# Altium schematic symbol library FPGA_Xilinx_Virtex7.SchLib: 34 symbols (part 34 of 34)
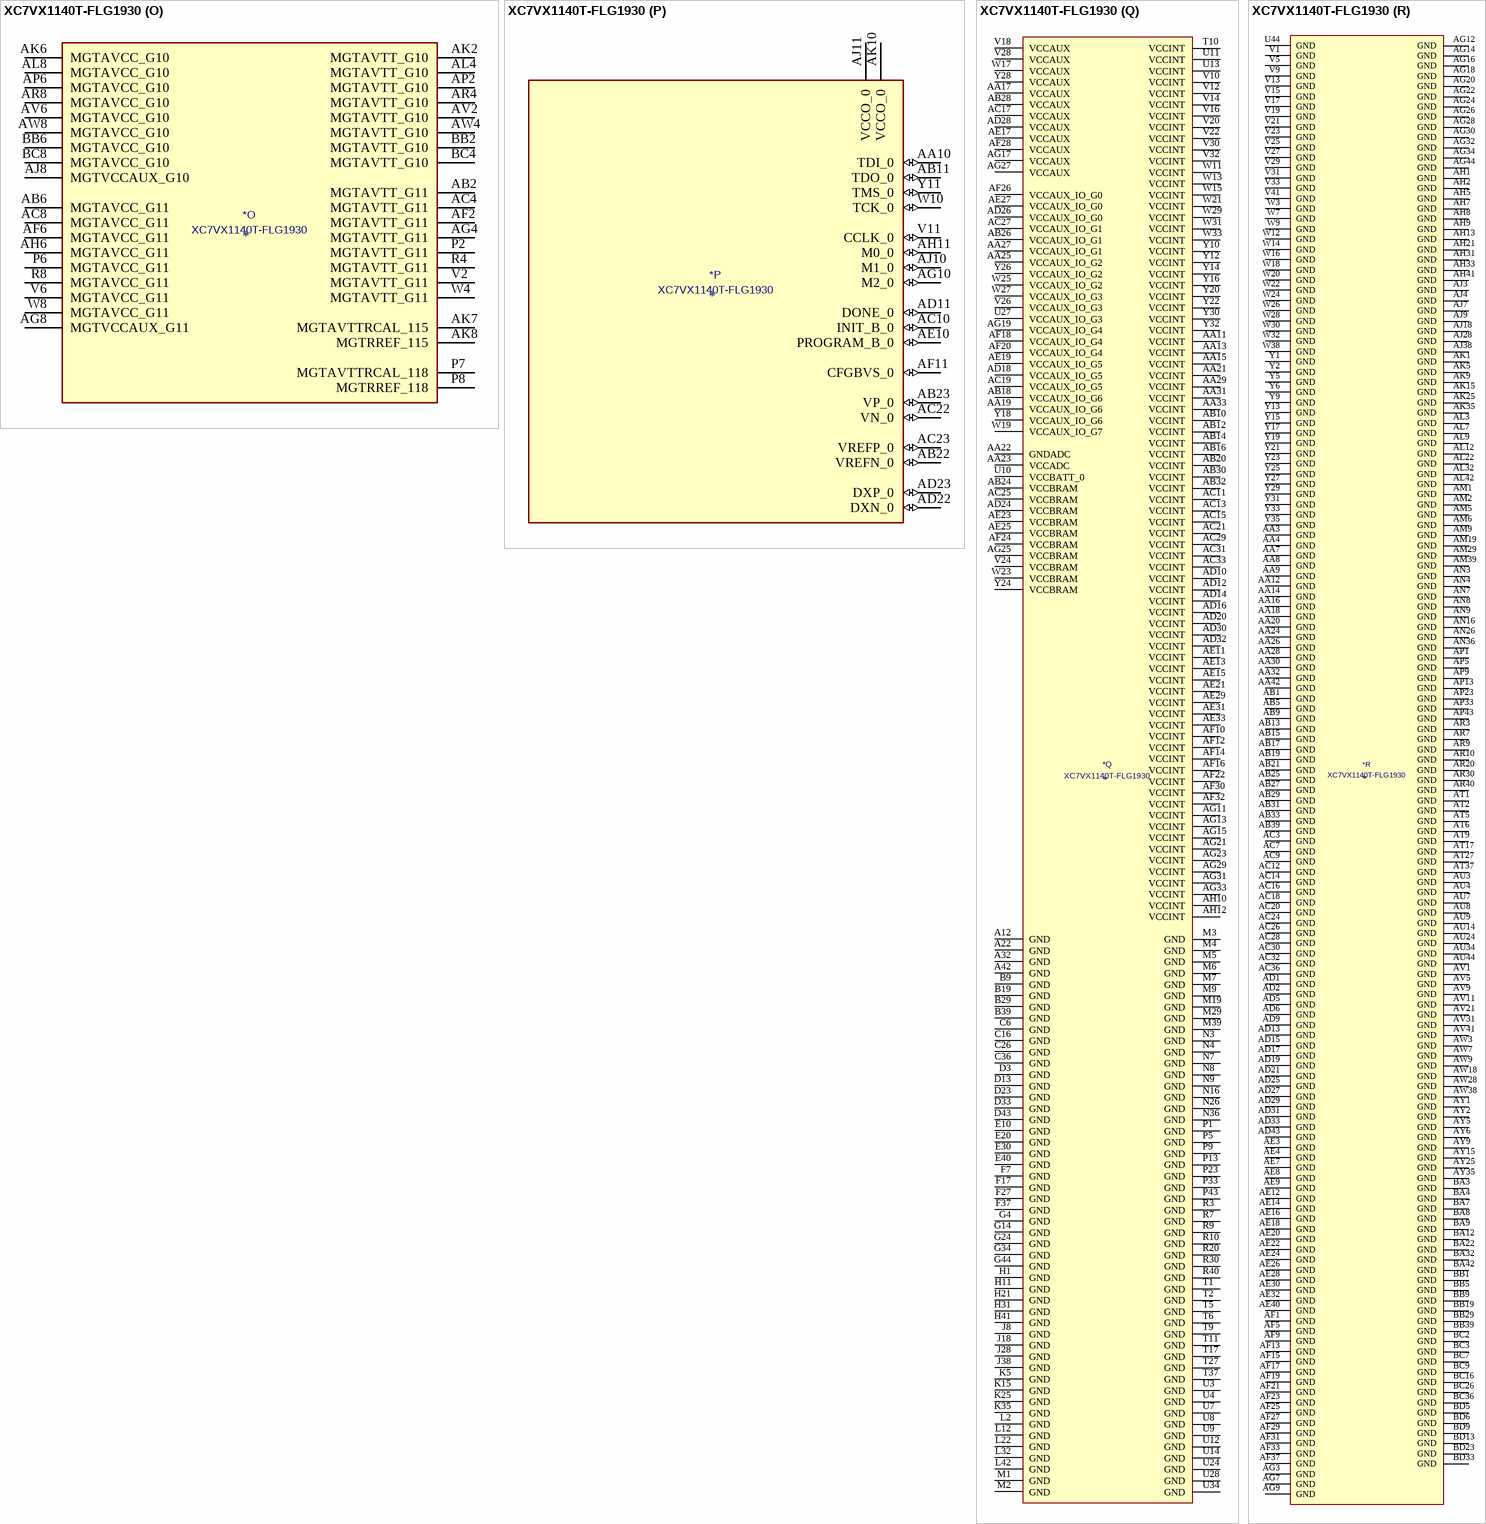
[diagram p205: symbol XC7VX1140T-FLG1930]

## XC7VX1140T-FLG1930
designator *  value XC7VX1140T-FLG1930
ki_keywords: FPGA; ki_description: Virtex 7 XT 1140 XC7VX1140T-FLG1930
part A pins: AH29 IO_L4P_T0_10 (io), AH30 IO_L4N_T0_10 (io), AJ29 IO_0_VRN_10 (io), AJ30 IO_L1P_T0_10 (io), AJ31 IO_L1N_T0_10 (io), AK29 IO_L2P_T0_10 (io), AK30 VCCO_10 (power), AK31 IO_L5P_T0_10 (io), AL29 IO_L2N_T0_10 (io), AL30 IO_L3P_T0_DQS_10 (io), AL31 IO_L5N_T0_10 (io), AM30 IO_L3N_T0_DQS_10 (io), AM31 IO_25_VRP_10 (io), AN29 IO_L6P_T0_10 (io), AN30 IO_L6N_T0_VREF_10 (io), AN31 VCCO_10 (power), AP29 IO_L8P_T1_10 (io), AP30 IO_L8N_T1_10 (io), AP31 IO_L7P_T1_10 (io), AR29 IO_L10P_T1_10 (io), AR31 IO_L7N_T1_10 (io), AT29 IO_L10N_T1_10 (io), AT30 IO_L9P_T1_DQS_10 (io), AT31 IO_L9N_T1_DQS_10 (io), AU29 VCCO_10 (power), AU30 IO_L11P_T1_SRCC_10 (io), AU31 IO_L11N_T1_SRCC_10 (io), AV29 IO_L12P_T1_MRCC_10 (io), AV30 IO_L12N_T1_MRCC_10 (io), AV32 IO_L13P_T2_MRCC_10 (io), AW29 IO_L15P_T2_DQS_10 (io), AW30 IO_L14P_T2_SRCC_10 (io), AW31 IO_L14N_T2_SRCC_10 (io), AW32 IO_L13N_T2_MRCC_10 (io), AW33 VCCO_10 (power), AW34 IO_0_VRN_11 (io), AW41 IO_L7P_T1_11 (io), AW42 IO_L6P_T0_11 (io), AW43 VCCO_11 (power), AW44 IO_L1P_T0_11 (io), AY29 IO_L15N_T2_DQS_10 (io), AY30 VCCO_10 (power), AY31 IO_L16P_T2_10 (io), AY32 IO_L16N_T2_10 (io), AY33 IO_L24P_T3_11 (io), AY34 IO_25_VRP_11 (io), AY36 IO_L18P_T2_11 (io), AY37 IO_L16P_T2_11 (io), AY38 IO_L16N_T2_11 (io), AY39 IO_L11P_T1_SRCC_11 (io), AY40 VCCO_11 (power), AY41 IO_L7N_T1_11 (io), AY42 IO_L6N_T0_VREF_11 (io), AY43 IO_L3P_T0_DQS_11 (io), AY44 IO_L1N_T0_11 (io), BA28 IO_L17P_T2_10 (io), BA29 IO_L17N_T2_10 (io), BA30 IO_L18P_T2_10 (io), BA31 IO_L18N_T2_10 (io), BA33 IO_L24N_T3_11 (io), BA34 IO_L19P_T3_11 (io), BA35 IO_L19N_T3_VREF_11 (io), BA36 IO_L18N_T2_11 (io), BA37 VCCO_11 (power), BA38 IO_L13P_T2_MRCC_11 (io), BA39 IO_L11N_T1_SRCC_11 (io), BA40 IO_L9P_T1_DQS_11 (io), BA41 IO_L9N_T1_DQS_11 (io), BA43 IO_L5P_T0_11 (io), BA44 IO_L3N_T0_DQS_11 (io), BB28 IO_L24P_T3_10 (io), BB30 IO_L22P_T3_10 (io), BB31 IO_L19P_T3_10 (io), BB32 IO_L19N_T3_VREF_10 (io), BB33 IO_L22P_T3_11 (io), BB34 VCCO_11 (power), BB35 IO_L23P_T3_11 (io), BB36 IO_L15P_T2_DQS_11 (io), BB37 IO_L15N_T2_DQS_11 (io), BB38 IO_L13N_T2_MRCC_11 (io), BB40 IO_L8P_T1_11 (io), BB41 IO_L8N_T1_11 (io), BB42 IO_L4P_T0_11 (io), BB43 IO_L5N_T0_11 (io), BB44 VCCO_11 (power), BC28 IO_L24N_T3_10 (io), BC29 IO_L23P_T3_10 (io), BC30 IO_L22N_T3_10 (io), BC31 VCCO_10 (power), BC32 IO_L20P_T3_10 (io), BC33 IO_L22N_T3_11 (io), BC34 IO_L20P_T3_11 (io), BC35 IO_L23N_T3_11 (io), BC37 IO_L17P_T2_11 (io), BC38 IO_L14P_T2_SRCC_11 (io), BC39 IO_L12P_T1_MRCC_11 (io), BC40 IO_L10P_T1_11 (io), BC41 VCCO_11 (power), BC42 IO_L2P_T0_11 (io), BC43 IO_L4N_T0_11 (io), BD29 IO_L23N_T3_10 (io), BD30 IO_L21P_T3_DQS_10 (io), BD31 IO_L21N_T3_DQS_10 (io), BD32 IO_L20N_T3_10 (io), BD34 IO_L20N_T3_11 (io), BD35 IO_L21P_T3_DQS_11 (io), BD36 IO_L21N_T3_DQS_11 (io), BD37 IO_L17N_T2_11 (io), BD38 VCCO_11 (power), BD39 IO_L14N_T2_SRCC_11 (io), BD40 IO_L12N_T1_MRCC_11 (io), BD41 IO_L10N_T1_11 (io), BD42 IO_L2N_T0_11 (io)
part B pins: AH26 VCCO_12 (power), AH27 IO_L2P_T0_12 (io), AH28 IO_0_VRN_12 (io), AJ25 IO_L3P_T0_DQS_12 (io), AJ26 IO_L3N_T0_DQS_12 (io), AJ27 IO_L2N_T0_12 (io), AK26 IO_L4P_T0_12 (io), AK27 IO_L4N_T0_12 (io), AK28 IO_L1P_T0_12 (io), AL25 IO_L5P_T0_12 (io), AL26 IO_L6P_T0_12 (io), AL27 VCCO_12 (power), AL28 IO_L1N_T0_12 (io), AM25 IO_L5N_T0_12 (io), AM26 IO_L6N_T0_VREF_12 (io), AM27 IO_25_VRP_12 (io), AM28 IO_L7P_T1_12 (io), AN25 IO_L8P_T1_12 (io), AN27 IO_L9P_T1_DQS_12 (io), AN28 IO_L7N_T1_12 (io), AP25 IO_L8N_T1_12 (io), AP26 IO_L10P_T1_12 (io), AP27 IO_L9N_T1_DQS_12 (io), AP28 VCCO_12 (power), AP32 IO_L24P_T3_13 (io), AP34 IO_L21P_T3_DQS_13 (io), AP35 IO_0_VRN_13 (io), AP36 IO_L15P_T2_DQS_13 (io), AP38 VCCO_13 (power), AR25 VCCO_12 (power), AR26 IO_L10N_T1_12 (io), AR27 IO_L11P_T1_SRCC_12 (io), AR28 IO_L11N_T1_SRCC_12 (io), AR32 IO_L24N_T3_13 (io), AR33 IO_L23P_T3_13 (io), AR34 IO_L21N_T3_DQS_13 (io), AR35 VCCO_13 (power), AR36 IO_L17P_T2_13 (io), AR37 IO_L15N_T2_DQS_13 (io), AR38 IO_L12P_T1_MRCC_13 (io), AR39 IO_L7P_T1_13 (io), AR41 IO_L6P_T0_13 (io), AR42 IO_L5P_T0_13 (io), AR43 IO_L5N_T0_13 (io), AR44 IO_L1P_T0_13 (io), AT25 IO_L12P_T1_MRCC_12 (io), AT26 IO_L12N_T1_MRCC_12 (io), AT28 IO_L13P_T2_MRCC_12 (io), AT32 VCCO_13 (power), AT33 IO_L23N_T3_13 (io), AT34 IO_L19P_T3_13 (io), AT35 IO_L19N_T3_VREF_13 (io), AT36 IO_L17N_T2_13 (io), AT38 IO_L11P_T1_SRCC_13 (io), AT39 IO_L12N_T1_MRCC_13 (io), AT40 IO_L7N_T1_13 (io), AT41 IO_L6N_T0_VREF_13 (io), AT42 VCCO_13 (power), AT43 IO_L3P_T0_DQS_13 (io), AT44 IO_L1N_T0_13 (io), AU25 IO_L15P_T2_DQS_12 (io), AU26 IO_L14P_T2_SRCC_12 (io), AU27 IO_L14N_T2_SRCC_12 (io), AU28 IO_L13N_T2_MRCC_12 (io), AU32 IO_L20P_T3_13 (io), AU33 IO_L20N_T3_13 (io), AU35 IO_25_VRP_13 (io), AU36 IO_L13P_T2_MRCC_13 (io), AU37 IO_L13N_T2_MRCC_13 (io), AU38 IO_L11N_T1_SRCC_13 (io), AU39 VCCO_13 (power), AU40 IO_L9P_T1_DQS_13 (io), AU41 IO_L9N_T1_DQS_13 (io), AU42 IO_L4P_T0_13 (io), AU43 IO_L3N_T0_DQS_13 (io), AV25 IO_L15N_T2_DQS_12 (io), AV26 VCCO_12 (power), AV27 IO_L18P_T2_12 (io), AV28 IO_L18N_T2_12 (io), AV33 IO_L22P_T3_13 (io), AV34 IO_L22N_T3_13 (io), AV35 IO_L16P_T2_13 (io), AV36 VCCO_13 (power), AV37 IO_L14P_T2_SRCC_13 (io), AV38 IO_L14N_T2_SRCC_13 (io), AV39 IO_L10P_T1_13 (io), AV40 IO_L8P_T1_13 (io), AV42 IO_L4N_T0_13 (io), AV43 IO_L2P_T0_13 (io), AV44 IO_L2N_T0_13 (io), AW25 IO_L17P_T2_12 (io), AW26 IO_L16P_T2_12 (io), AW27 IO_L16N_T2_12 (io), AW35 IO_L16N_T2_13 (io), AW36 IO_L18P_T2_13 (io), AW37 IO_L18N_T2_13 (io), AW39 IO_L10N_T1_13 (io), AW40 IO_L8N_T1_13 (io), AY26 IO_L17N_T2_12 (io), AY27 IO_L19P_T3_12 (io), AY28 IO_L19N_T3_VREF_12 (io), BA25 IO_L21P_T3_DQS_12 (io), BA26 IO_L21N_T3_DQS_12 (io), BA27 VCCO_12 (power), BB25 IO_L20P_T3_12 (io), BB26 IO_L20N_T3_12 (io), BB27 IO_L22P_T3_12 (io), BC25 IO_L23P_T3_12 (io), BC27 IO_L22N_T3_12 (io), BD25 IO_L23N_T3_12 (io), BD26 IO_L24P_T3_12 (io), BD27 IO_L24N_T3_12 (io), BD28 VCCO_12 (power)
part C pins: AH22 IO_L2P_T0_D02_14 (io), AH23 IO_L2N_T0_D03_14 (io), AH24 IO_L1P_T0_D00_MOSI_14 (io), AH25 IO_L1N_T0_D01_DIN_14 (io), AH32 IO_L21P_T3_DQS_15 (io), AJ21 IO_0_VRN_14 (io), AJ22 IO_L6P_T0_FCS_B_14 (io), AJ23 VCCO_14 (power), AJ24 IO_L5P_T0_D06_14 (io), AJ32 IO_L21N_T3_DQS_A18_15 (io), AJ33 VCCO_15 (power), AJ34 IO_L19P_T3_A22_15 (io), AJ35 IO_0_VRN_15 (io), AJ36 IO_L13P_T2_MRCC_15 (io), AK21 IO_L4P_T0_D04_14 (io), AK22 IO_L6N_T0_D08_VREF_14 (io), AK23 IO_L3P_T0_DQS_PUDC_B_14 (io), AK24 IO_L5N_T0_D07_14 (io), AK32 IO_L20P_T3_A20_15 (io), AK33 IO_L20N_T3_A19_15 (io), AK34 IO_L19N_T3_A21_VREF_15 (io), AK36 IO_L16P_T2_A28_15 (io), AK37 IO_L13N_T2_MRCC_15 (io), AK38 IO_L11P_T1_SRCC_15 (io), AK39 IO_L9P_T1_DQS_AD3P_15 (io), AK40 VCCO_15 (power), AK41 IO_L6P_T0_15 (io), AL21 IO_L4N_T0_D05_14 (io), AL23 IO_L3N_T0_DQS_EMCCLK_14 (io), AL24 IO_25_VRP_14 (io), AL33 IO_L23P_T3_FOE_B_15 (io), AL34 IO_L23N_T3_FWE_B_15 (io), AL35 IO_L18P_T2_A24_15 (io), AL36 IO_L16N_T2_A27_15 (io), AL37 VCCO_15 (power), AL38 IO_L11N_T1_SRCC_15 (io), AL39 IO_L9N_T1_DQS_AD3N_15 (io), AL40 IO_L7P_T1_AD2P_15 (io), AL41 IO_L6N_T0_VREF_15 (io), AL43 IO_L1P_T0_AD0P_15 (io), AL44 IO_L1N_T0_AD0N_15 (io), AM21 IO_L8P_T1_D11_14 (io), AM22 IO_L8N_T1_D12_14 (io), AM23 IO_L7P_T1_D09_14 (io), AM24 VCCO_14 (power), AM32 IO_L22P_T3_A17_15 (io), AM33 IO_L22N_T3_A16_15 (io), AM34 VCCO_15 (power), AM35 IO_L17P_T2_A26_15 (io), AM36 IO_L18N_T2_A23_15 (io), AM37 IO_L14P_T2_SRCC_15 (io), AM38 IO_L14N_T2_SRCC_15 (io), AM40 IO_L7N_T1_AD2N_15 (io), AM41 IO_L2P_T0_AD8P_15 (io), AM42 IO_L2N_T0_AD8N_15 (io), AM43 IO_L5P_T0_AD9P_15 (io), AM44 VCCO_15 (power), AN21 VCCO_14 (power), AN22 IO_L10P_T1_D14_14 (io), AN23 IO_L7N_T1_D10_14 (io), AN24 IO_L9P_T1_DQS_14 (io), AN32 IO_25_VRP_15 (io), AN33 IO_L24P_T3_RS1_15 (io), AN34 IO_L24N_T3_RS0_15 (io), AN35 IO_L17N_T2_A25_15 (io), AN37 IO_L15P_T2_DQS_15 (io), AN38 IO_L12P_T1_MRCC_15 (io), AN39 IO_L12N_T1_MRCC_15 (io), AN40 IO_L8P_T1_AD10P_15 (io), AN41 VCCO_15 (power), AN42 IO_L4P_T0_15 (io), AN43 IO_L5N_T0_AD9N_15 (io), AN44 IO_L3P_T0_DQS_AD1P_15 (io), AP21 IO_L12P_T1_MRCC_14 (io), AP22 IO_L10N_T1_D15_14 (io), AP24 IO_L9N_T1_DQS_D13_14 (io), AP37 IO_L15N_T2_DQS_ADV_B_15 (io), AP39 IO_L10P_T1_AD11P_15 (io), AP40 IO_L10N_T1_AD11N_15 (io), AP41 IO_L8N_T1_AD10N_15 (io), AP42 IO_L4N_T0_15 (io), AP44 IO_L3N_T0_DQS_AD1N_15 (io), AR21 IO_L13P_T2_MRCC_14 (io), AR22 IO_L12N_T1_MRCC_14 (io), AR23 IO_L11P_T1_SRCC_14 (io), AR24 IO_L11N_T1_SRCC_14 (io), AT21 IO_L13N_T2_MRCC_14 (io), AT22 VCCO_14 (power), AT23 IO_L14P_T2_SRCC_14 (io), AT24 IO_L14N_T2_SRCC_14 (io), AU21 IO_L15P_T2_DQS_RDWR_B_14 (io), AU22 IO_L15N_T2_DQS_DOUT_CSO_B_14 (io), AU23 IO_L16P_T2_CSI_B_14 (io), AV22 IO_L17P_T2_A14_D30_14 (io), AV23 IO_L16N_T2_A15_D31_14 (io), AV24 IO_L18P_T2_A12_D28_14 (io), AW22 IO_L17N_T2_A13_D29_14 (io), AW23 VCCO_14 (power), AW24 IO_L18N_T2_A11_D27_14 (io), AY22 IO_L19P_T3_A10_D26_14 (io), AY23 IO_L19N_T3_A09_D25_VREF_14 (io), AY24 IO_L20P_T3_A08_D24_14 (io), BA23 IO_L22P_T3_A05_D21_14 (io), BA24 IO_L20N_T3_A07_D23_14 (io), BB22 IO_L23P_T3_A03_D19_14 (io), BB23 IO_L22N_T3_A04_D20_14 (io), BB24 VCCO_14 (power), BC22 IO_L21P_T3_DQS_14 (io), BC23 IO_L23N_T3_A02_D18_14 (io), BC24 IO_L24P_T3_A01_D17_14 (io), BD22 IO_L21N_T3_DQS_A06_D22_14 (io), BD24 IO_L24N_T3_A00_D16_14 (io)
part D pins: AA34 IO_L22P_T3_17 (io), AA35 IO_L21N_T3_DQS_17 (io), AA36 IO_L19P_T3_17 (io), AA37 VCCO_17 (power), AA38 IO_L15N_T2_DQS_17 (io), AA39 IO_L14P_T2_SRCC_17 (io), AA40 IO_L14N_T2_SRCC_17 (io), AA41 IO_L9N_T1_DQS_17 (io), AA43 IO_L1P_T0_17 (io), AA44 IO_L1N_T0_17 (io), AB34 VCCO_17 (power), AB35 IO_L21P_T3_DQS_17 (io), AB36 IO_L23P_T3_17 (io), AB37 IO_L23N_T3_17 (io), AB38 IO_L15P_T2_DQS_17 (io), AB40 IO_L12N_T1_MRCC_17 (io), AB41 IO_L9P_T1_DQS_17 (io), AB42 IO_L8N_T1_17 (io), AB43 IO_L5N_T0_17 (io), AB44 VCCO_17 (power), AC34 IO_L24P_T3_17 (io), AC35 IO_L24N_T3_17 (io), AC37 IO_25_VRP_17 (io), AC38 IO_L17P_T2_17 (io), AC39 IO_L17N_T2_17 (io), AC40 IO_L12P_T1_MRCC_17 (io), AC41 VCCO_17 (power), AC42 IO_L8P_T1_17 (io), AC43 IO_L5P_T0_17 (io), AC44 IO_L3N_T0_DQS_17 (io), AD34 IO_L20P_T3_16 (io), AD35 IO_L20N_T3_16 (io), AD36 IO_L19P_T3_16 (io), AD37 IO_0_VRN_16 (io), AD38 VCCO_16 (power), AD39 IO_L7P_T1_16 (io), AD40 IO_L7N_T1_16 (io), AD41 IO_L10P_T1_17 (io), AD42 IO_L10N_T1_17 (io), AD44 IO_L3P_T0_DQS_17 (io), AE34 IO_L21P_T3_DQS_16 (io), AE35 VCCO_16 (power), AE36 IO_L22P_T3_16 (io), AE37 IO_L19N_T3_VREF_16 (io), AE38 IO_L16P_T2_16 (io), AE39 IO_L16N_T2_16 (io), AE41 IO_L9P_T1_DQS_16 (io), AE42 IO_L9N_T1_DQS_16 (io), AE43 IO_L5P_T0_16 (io), AE44 IO_L3P_T0_DQS_16 (io), AF34 IO_L21N_T3_DQS_16 (io), AF35 IO_L23P_T3_16 (io), AF36 IO_L22N_T3_16 (io), AF38 IO_L18P_T2_16 (io), AF39 IO_L13P_T2_MRCC_16 (io), AF40 IO_L13N_T2_MRCC_16 (io), AF41 IO_L8P_T1_16 (io), AF42 VCCO_16 (power), AF43 IO_L5N_T0_16 (io), AF44 IO_L3N_T0_DQS_16 (io), AG35 IO_L24P_T3_16 (io), AG36 IO_L23N_T3_16 (io), AG37 IO_L15P_T2_DQS_16 (io), AG38 IO_L18N_T2_16 (io), AG39 VCCO_16 (power), AG40 IO_L11P_T1_SRCC_16 (io), AG41 IO_L8N_T1_16 (io), AG42 IO_L10P_T1_16 (io), AG43 IO_L2P_T0_16 (io), AH34 IO_25_VRP_16 (io), AH35 IO_L24N_T3_16 (io), AH36 VCCO_16 (power), AH37 IO_L17P_T2_16 (io), AH38 IO_L15N_T2_DQS_16 (io), AH39 IO_L14P_T2_SRCC_16 (io), AH40 IO_L11N_T1_SRCC_16 (io), AH42 IO_L10N_T1_16 (io), AH43 IO_L2N_T0_16 (io), AH44 IO_L1P_T0_16 (io), AJ37 IO_L17N_T2_16 (io), AJ39 IO_L14N_T2_SRCC_16 (io), AJ40 IO_L12P_T1_MRCC_16 (io), AJ41 IO_L12N_T1_MRCC_16 (io), AJ42 IO_L6P_T0_16 (io), AJ43 VCCO_16 (power), AJ44 IO_L1N_T0_16 (io), AK42 IO_L6N_T0_VREF_16 (io), AK43 IO_L4P_T0_16 (io), AK44 IO_L4N_T0_16 (io), V42 IO_L7N_T1_17 (io), V43 IO_L2P_T0_17 (io), V44 IO_L2N_T0_17 (io), W34 IO_L20P_T3_17 (io), W35 IO_L20N_T3_17 (io), W36 IO_0_VRN_17 (io), W37 IO_L16N_T2_17 (io), W39 IO_L18N_T2_17 (io), W40 IO_L13N_T2_MRCC_17 (io), W41 IO_L11N_T1_SRCC_17 (io), W42 IO_L7P_T1_17 (io), W43 VCCO_17 (power), W44 IO_L4N_T0_17 (io), Y34 IO_L22N_T3_17 (io), Y36 IO_L19N_T3_VREF_17 (io), Y37 IO_L16P_T2_17 (io), Y38 IO_L18P_T2_17 (io), Y39 IO_L13P_T2_MRCC_17 (io), Y40 VCCO_17 (power), Y41 IO_L11P_T1_SRCC_17 (io), Y42 IO_L6P_T0_17 (io), Y43 IO_L6N_T0_VREF_17 (io), Y44 IO_L4P_T0_17 (io)
part E pins: K33 IO_L4N_T0_19 (io), K34 IO_L8N_T1_19 (io), K36 IO_L12N_T1_MRCC_19 (io), K37 IO_L13P_T2_MRCC_19 (io), K38 IO_L13N_T2_MRCC_19 (io), K39 IO_L16N_T2_19 (io), K40 VCCO_19 (power), K41 IO_L19N_T3_VREF_19 (io), K42 IO_L21P_T3_DQS_19 (io), K43 IO_L21N_T3_DQS_19 (io), K44 IO_L24N_T3_19 (io), L30 IO_0_VRN_19 (io), L31 IO_L2N_T0_19 (io), L33 IO_L4P_T0_19 (io), L34 IO_L8P_T1_19 (io), L35 IO_L10N_T1_19 (io), L36 IO_L12P_T1_MRCC_19 (io), L37 VCCO_19 (power), L38 IO_L14N_T2_SRCC_19 (io), L39 IO_L16P_T2_19 (io), L40 IO_L18N_T2_19 (io), L41 IO_L19P_T3_19 (io), L43 IO_L23N_T3_19 (io), L44 IO_L24P_T3_19 (io), M30 IO_L2P_T0_19 (io), M31 IO_L1P_T0_19 (io), M32 IO_L1N_T0_19 (io), M33 IO_L6N_T0_VREF_19 (io), M34 VCCO_19 (power), M35 IO_L10P_T1_19 (io), M36 IO_L9N_T1_DQS_19 (io), M37 IO_L11N_T1_SRCC_19 (io), M38 IO_L14P_T2_SRCC_19 (io), M40 IO_L18P_T2_19 (io), M41 IO_L17N_T2_19 (io), M42 IO_L20N_T3_19 (io), M43 IO_L23P_T3_19 (io), M44 VCCO_19 (power), N30 IO_L3N_T0_DQS_19 (io), N31 VCCO_19 (power), N32 IO_L6P_T0_19 (io), N33 IO_25_VRP_19 (io), N34 IO_L7N_T1_19 (io), N35 IO_L9P_T1_DQS_19 (io), N37 IO_L11P_T1_SRCC_19 (io), N38 IO_L15P_T2_DQS_19 (io), N39 IO_L15N_T2_DQS_19 (io), N40 IO_L17P_T2_19 (io), N41 VCCO_19 (power), N42 IO_L20P_T3_19 (io), N43 IO_L22P_T3_19 (io), N44 IO_L22N_T3_19 (io), P30 IO_L3P_T0_DQS_19 (io), P31 IO_L5P_T0_19 (io), P32 IO_L5N_T0_19 (io), P34 IO_L7P_T1_19 (io), P35 IO_0_VRN_18 (io), P36 IO_L8N_T1_18 (io), P37 IO_L12N_T1_MRCC_18 (io), P38 VCCO_18 (power), P39 IO_L15P_T2_DQS_18 (io), P40 IO_L15N_T2_DQS_18 (io), P41 IO_L21P_T3_DQS_18 (io), P42 IO_L21N_T3_DQS_18 (io), P44 IO_L24N_T3_18 (io), R31 IO_L2P_T0_18 (io), R32 IO_L2N_T0_18 (io), R33 IO_L4P_T0_18 (io), R34 IO_L4N_T0_18 (io), R35 VCCO_18 (power), R36 IO_L8P_T1_18 (io), R37 IO_L12P_T1_MRCC_18 (io), R38 IO_L14P_T2_SRCC_18 (io), R39 IO_L14N_T2_SRCC_18 (io), R41 IO_L19N_T3_VREF_18 (io), R42 IO_L23P_T3_18 (io), R43 IO_L23N_T3_18 (io), R44 IO_L24P_T3_18 (io), T30 IO_L1P_T0_18 (io), T31 IO_L1N_T0_18 (io), T32 VCCO_18 (power), T33 IO_L6P_T0_18 (io), T34 IO_L6N_T0_VREF_18 (io), T35 IO_L10P_T1_18 (io), T36 IO_L10N_T1_18 (io), T38 IO_L13N_T2_MRCC_18 (io), T39 IO_L17P_T2_18 (io), T40 IO_L17N_T2_18 (io), T41 IO_L19P_T3_18 (io), T42 VCCO_18 (power), T43 IO_L22P_T3_18 (io), T44 IO_L22N_T3_18 (io), U30 IO_L3P_T0_DQS_18 (io), U31 IO_L3N_T0_DQS_18 (io), U32 IO_L5P_T0_18 (io), U33 IO_L5N_T0_18 (io), U35 IO_L9N_T1_DQS_18 (io), U36 IO_L7P_T1_18 (io), U37 IO_L7N_T1_18 (io), U38 IO_L13P_T2_MRCC_18 (io), U39 VCCO_18 (power), U40 IO_L18P_T2_18 (io), U41 IO_L18N_T2_18 (io), U42 IO_L20P_T3_18 (io), U43 IO_L20N_T3_18 (io), V34 IO_25_VRP_18 (io), V35 IO_L9P_T1_DQS_18 (io), V36 VCCO_18 (power), V37 IO_L11P_T1_SRCC_18 (io), V38 IO_L11N_T1_SRCC_18 (io), V39 IO_L16P_T2_18 (io), V40 IO_L16N_T2_18 (io)
part F pins: A31 IO_L4N_T0_21 (io), A33 IO_L2P_T0_21 (io), A34 IO_L2N_T0_21 (io), A35 IO_L8P_T1_21 (io), A36 IO_L8N_T1_21 (io), A37 VCCO_21 (power), A38 IO_L13N_T2_MRCC_21 (io), A39 IO_L15P_T2_DQS_21 (io), A40 IO_L15N_T2_DQS_21 (io), A41 IO_L17N_T2_21 (io), B31 IO_L4P_T0_21 (io), B32 IO_L1P_T0_21 (io), B33 IO_L1N_T0_21 (io), B34 VCCO_21 (power), B35 IO_L10P_T1_21 (io), B36 IO_L10N_T1_21 (io), B37 IO_L12N_T1_MRCC_21 (io), B38 IO_L13P_T2_MRCC_21 (io), B40 IO_L18N_T2_21 (io), B41 IO_L17P_T2_21 (io), B42 IO_L20P_T3_21 (io), B43 IO_L20N_T3_21 (io), C31 VCCO_21 (power), C32 IO_0_VRN_21 (io), C33 IO_L3P_T0_DQS_21 (io), C34 IO_L3N_T0_DQS_21 (io), C35 IO_L5N_T0_21 (io), C37 IO_L12P_T1_MRCC_21 (io), C38 IO_L11N_T1_SRCC_21 (io), C39 IO_L14N_T2_SRCC_21 (io), C40 IO_L18P_T2_21 (io), C41 VCCO_21 (power), C42 IO_L22P_T3_21 (io), C43 IO_L22N_T3_21 (io), C44 IO_L23N_T3_21 (io), D31 IO_L6P_T0_21 (io), D32 IO_L6N_T0_VREF_21 (io), D34 IO_L5P_T0_21 (io), D35 IO_25_VRP_21 (io), D36 IO_L7N_T1_21 (io), D37 IO_L11P_T1_SRCC_21 (io), D38 VCCO_21 (power), D39 IO_L14P_T2_SRCC_21 (io), D40 IO_L16N_T2_21 (io), D41 IO_L19N_T3_VREF_21 (io), D42 IO_L21N_T3_DQS_21 (io), D44 IO_L23P_T3_21 (io), E31 IO_0_VRN_20 (io), E32 IO_L4P_T0_20 (io), E33 IO_L4N_T0_20 (io), E34 IO_L8N_T1_20 (io), E35 VCCO_20 (power), E36 IO_L7P_T1_21 (io), E37 IO_L9P_T1_DQS_21 (io), E38 IO_L9N_T1_DQS_21 (io), E39 IO_L16P_T2_21 (io), E41 IO_L19P_T3_21 (io), E42 IO_L21P_T3_DQS_21 (io), E43 IO_L24P_T3_21 (io), E44 IO_L24N_T3_21 (io), F31 IO_L2N_T0_20 (io), F32 VCCO_20 (power), F33 IO_L6N_T0_VREF_20 (io), F34 IO_L8P_T1_20 (io), F35 IO_L10P_T1_20 (io), F36 IO_L10N_T1_20 (io), F38 IO_L15P_T2_DQS_20 (io), F39 IO_L15N_T2_DQS_20 (io), F40 IO_L17N_T2_20 (io), F41 IO_L19N_T3_VREF_20 (io), F42 VCCO_21 (power), F43 IO_L21P_T3_DQS_20 (io), F44 IO_L21N_T3_DQS_20 (io), G31 IO_L2P_T0_20 (io), G32 IO_L1N_T0_20 (io), G33 IO_L6P_T0_20 (io), G35 IO_L9N_T1_DQS_20 (io), G36 IO_L12P_T1_MRCC_20 (io), G37 IO_L12N_T1_MRCC_20 (io), G38 IO_L14N_T2_SRCC_20 (io), G39 VCCO_20 (power), G40 IO_L17P_T2_20 (io), G41 IO_L19P_T3_20 (io), G42 IO_L23P_T3_20 (io), G43 IO_L23N_T3_20 (io), H32 IO_L1P_T0_20 (io), H33 IO_25_VRP_20 (io), H34 IO_L7N_T1_20 (io), H35 IO_L9P_T1_DQS_20 (io), H36 VCCO_20 (power), H37 IO_L13N_T2_MRCC_20 (io), H38 IO_L14P_T2_SRCC_20 (io), H39 IO_L16P_T2_20 (io), H40 IO_L16N_T2_20 (io), H42 IO_L24P_T3_20 (io), H43 IO_L24N_T3_20 (io), H44 IO_L22N_T3_20 (io), J31 IO_L3P_T0_DQS_20 (io), J32 IO_L3N_T0_DQS_20 (io), J33 VCCO_20 (power), J34 IO_L7P_T1_20 (io), J35 IO_L11P_T1_SRCC_20 (io), J36 IO_L11N_T1_SRCC_20 (io), J37 IO_L13P_T2_MRCC_20 (io), J39 IO_L18P_T2_20 (io), J40 IO_L18N_T2_20 (io), J41 IO_L20P_T3_20 (io), J42 IO_L20N_T3_20 (io), J43 VCCO_20 (power), J44 IO_L22P_T3_20 (io), K31 IO_L5P_T0_20 (io), K32 IO_L5N_T0_20 (io)
part G pins: AH14 IO_0_VRN_31 (io), AH15 IO_L4P_T0_31 (io), AH16 VCCO_31 (power), AH17 IO_25_VRP_30 (io), AH18 IO_0_VRN_30 (io), AH19 IO_L3P_T0_DQS_30 (io), AH20 IO_L5P_T0_30 (io), AJ14 IO_L1P_T0_31 (io), AJ15 IO_L4N_T0_31 (io), AJ16 IO_L2P_T0_31 (io), AJ17 IO_L1P_T0_30 (io), AJ19 IO_L3N_T0_DQS_30 (io), AJ20 IO_L5N_T0_30 (io), AK14 IO_L1N_T0_31 (io), AK16 IO_L2N_T0_31 (io), AK17 IO_L1N_T0_30 (io), AK18 IO_L2P_T0_30 (io), AK19 IO_L4P_T0_30 (io), AK20 VCCO_30 (power), AL14 IO_L3N_T0_DQS_31 (io), AL15 IO_L3P_T0_DQS_31 (io), AL16 IO_L5P_T0_31 (io), AL17 VCCO_30 (power), AL18 IO_L2N_T0_30 (io), AL19 IO_L4N_T0_30 (io), AL20 IO_L6P_T0_30 (io), AM14 VCCO_31 (power), AM15 IO_L6P_T0_31 (io), AM16 IO_L5N_T0_31 (io), AM17 IO_25_VRP_31 (io), AM18 IO_L7P_T1_30 (io), AM20 IO_L6N_T0_VREF_30 (io), AN15 IO_L6N_T0_VREF_31 (io), AN17 IO_L7N_T1_30 (io), AN18 IO_L8N_T1_30 (io), AN19 IO_L8P_T1_30 (io), AN20 IO_L10P_T1_30 (io), AP14 IO_L8N_T1_31 (io), AP15 IO_L8P_T1_31 (io), AP16 IO_L10P_T1_31 (io), AP17 IO_L7P_T1_31 (io), AP18 VCCO_30 (power), AP19 IO_L9P_T1_DQS_30 (io), AP20 IO_L10N_T1_30 (io), AR14 IO_L9P_T1_DQS_31 (io), AR15 VCCO_31 (power), AR16 IO_L10N_T1_31 (io), AR17 IO_L7N_T1_31 (io), AR18 IO_L9N_T1_DQS_30 (io), AR19 IO_L12P_T1_MRCC_30 (io), AT14 IO_L9N_T1_DQS_31 (io), AT15 IO_L11P_T1_SRCC_31 (io), AT16 IO_L12P_T1_MRCC_31 (io), AT18 IO_L12N_T1_MRCC_30 (io), AT19 IO_L11N_T1_SRCC_30 (io), AT20 IO_L11P_T1_SRCC_30 (io), AU15 IO_L11N_T1_SRCC_31 (io), AU16 IO_L12N_T1_MRCC_31 (io), AU17 IO_L14P_T2_SRCC_31 (io), AU18 IO_L14P_T2_SRCC_30 (io), AU19 VCCO_30 (power), AU20 IO_L13P_T2_MRCC_30 (io), AV14 IO_L13N_T2_MRCC_31 (io), AV15 IO_L13P_T2_MRCC_31 (io), AV16 VCCO_31 (power), AV17 IO_L14N_T2_SRCC_31 (io), AV18 IO_L14N_T2_SRCC_30 (io), AV19 IO_L15P_T2_DQS_30 (io), AV20 IO_L13N_T2_MRCC_30 (io), AW14 IO_L15P_T2_DQS_31 (io), AW15 IO_L17N_T2_31 (io), AW16 IO_L17P_T2_31 (io), AW17 IO_L18P_T2_31 (io), AW19 IO_L15N_T2_DQS_30 (io), AW20 IO_L18P_T2_30 (io), AW21 IO_L16P_T2_30 (io), AY14 IO_L15N_T2_DQS_31 (io), AY16 IO_L16P_T2_31 (io), AY17 IO_L18N_T2_31 (io), AY18 IO_L17P_T2_30 (io), AY19 IO_L18N_T2_30 (io), AY20 VCCO_30 (power), AY21 IO_L16N_T2_30 (io), BA14 IO_L19N_T3_VREF_31 (io), BA15 IO_L19P_T3_31 (io), BA16 IO_L16N_T2_31 (io), BA17 VCCO_31 (power), BA18 IO_L17N_T2_30 (io), BA19 IO_L19N_T3_VREF_30 (io), BA20 IO_L19P_T3_30 (io), BA21 IO_L20P_T3_30 (io), BB14 VCCO_31 (power), BB15 IO_L20N_T3_31 (io), BB16 IO_L20P_T3_31 (io), BB17 IO_L23P_T3_31 (io), BB18 IO_L23P_T3_30 (io), BB20 IO_L22P_T3_30 (io), BB21 IO_L20N_T3_30 (io), BC14 IO_L22N_T3_31 (io), BC15 IO_L22P_T3_31 (io), BC17 IO_L23N_T3_31 (io), BC18 IO_L23N_T3_30 (io), BC19 IO_L21P_T3_DQS_30 (io), BC20 IO_L22N_T3_30 (io), BC21 VCCO_30 (power), BD14 IO_L21N_T3_DQS_31 (io), BD15 IO_L21P_T3_DQS_31 (io), BD16 IO_L24N_T3_31 (io), BD17 IO_L24P_T3_31 (io), BD18 VCCO_30 (power), BD19 IO_L21N_T3_DQS_30 (io), BD20 IO_L24N_T3_30 (io), BD21 IO_L24P_T3_30 (io)